# Altium footprint library 定位手表.PcbLib: 35 footprints (part 2 of 3)
Each footprint in its own frame and in the unit in brackets; x right, y up, seen from the top. Pads: shape width x height; smd on the part's side, far side on the other; paste and mask are expansions set on the pad; w line width, h text height; cw(c..) or ccw(c..) is an arc to the next point about the centre after c.
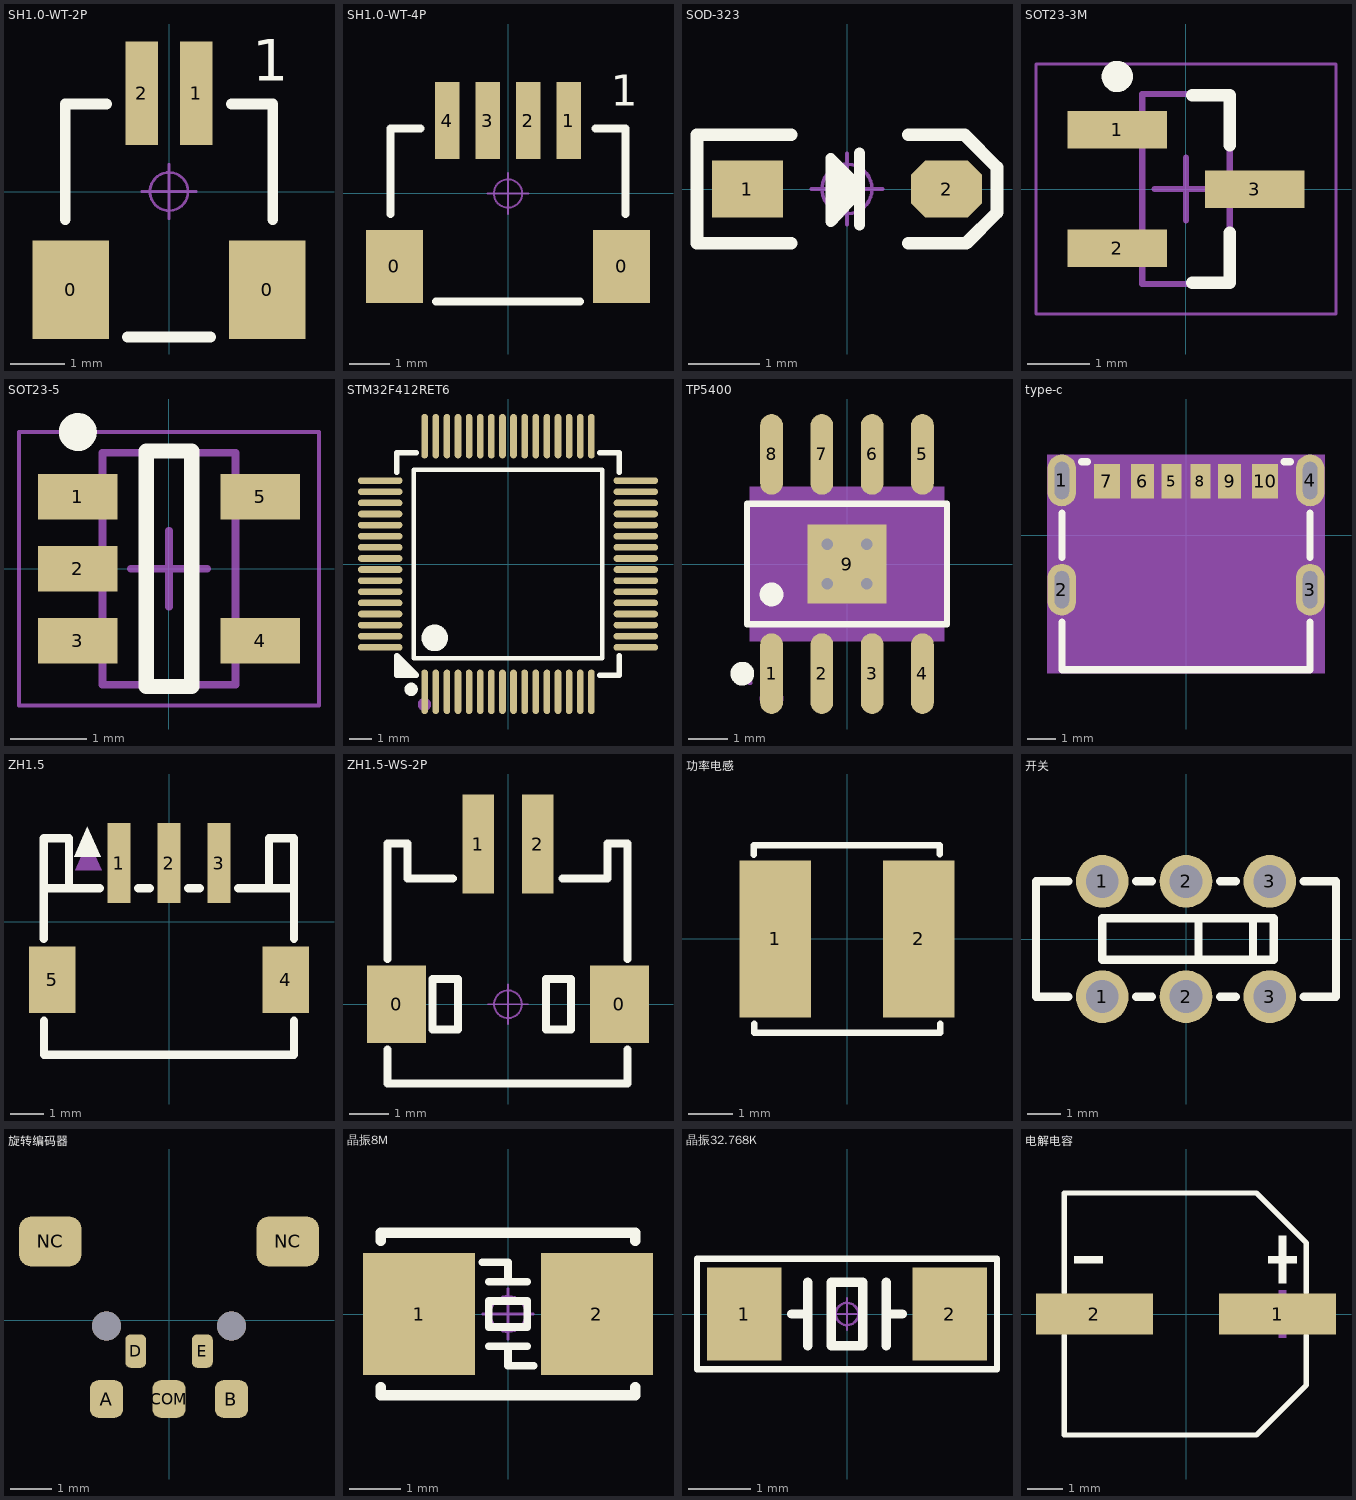
[diagram p1: the footprints below, top view; thin cyan lines are the x and y axes]

## SH1.0-WT-2P [mm] "SH1.0连接器-卧贴-2P                联系卖家 免费查找封装"
pads (4):
  rect 1.4x1.8 smd: 0(-1.8,-1.8) 0(1.8,-1.8)
  rect 0.6x1.9 smd: 1(0.5,1.8) 2(-0.5,1.8)
Top Overlay:
  lines w0.2: -1.9,-0.508 -1.9,1.6 -1.143,1.6 ; -0.762,-2.667 0.762,-2.667 ; 1.143,1.6 1.8,1.6 1.9,1.6 1.9,1.5 1.9,-0.508
  text "1" at 1.524,2.032 h0.76
Mechanical 15:
  circle w0.05: c0,0 r0.35
  lines w0.05: -0.5,0 0.5,0 ; 0,-0.5 0,0.5
3D body "SH1.0-WT-2P.STEP": height 2.9, standoff 0, extent -2,-2.667 2,2.283

## SH1.0-WT-4P [mm] "SH1.0连接器-卧贴-4P"
pads (6):
  rect 1.4x1.8 smd: 0(-2.8,-1.8) 0(2.8,-1.8)
  rect 0.6x1.9 smd: 1(1.5,1.8) 2(0.5,1.8) 3(-0.5,1.8) 4(-1.5,1.8)
Top Overlay:
  lines w0.2: -2.9,-0.508 -2.9,1.6 -2.159,1.6 ; -1.778,-2.667 1.778,-2.667 ; 2.159,1.6 2.8,1.6 2.9,1.6 2.9,1.5 2.9,-0.508
  text "1" at 2.54,2.159 h0.76
Mechanical 15:
  circle w0.05: c0,0 r0.35
  lines w0.05: -0.5,0 0.5,0 ; 0,-0.5 0,0.5
3D body "SH1.0-WT-4P.STEP": height 2.9, standoff 0, extent -3,-2.6 3,2.35

## SOD-323 [mm] "1.8x1.3X0.9mm"
pads (2):
  rect 1x0.8 smd: 1(-1.4,0)
  oct 1x0.8 smd: 2(1.4,0)
Top Overlay:
  lines w0.152: 0.178,-0.508 0.178,0.508 ; 0.178,-0.025 -0.229,-0.457 -0.229,0.432 0.178,0.025
  lines w0.178: -0.787,-0.762 -2.108,-0.762 -2.108,0.762 -0.787,0.762 ; 0.864,-0.762 1.676,-0.762 2.108,-0.33 2.108,0.305 1.651,0.762 0.864,0.762
  lines w0.254: -0.127,0.254 -0.152,-0.178 0.025,-0.025 -0.025,0.127
Mechanical 15:
  circle w0.05: c0,0 r0.35
  lines w0.05: -0.5,0 0.5,0 ; 0,-0.5 0,0.5
3D body "SOD-323.STEP": height 0.95, standoff 0, extent -1.324,-0.65 1.324,0.65

## SOT23-3M [mm] "SOT23, 3-Leads, Body 2.9x1.3mm, Pitch 0.95mm, Lead Span 2.4mm, IPC Low Density"
height 1.12
pads (3):
  rect 1.6x0.6 smd: 1(-1.1,0.95) 2(-1.1,-0.95) 3(1.1,0)
Top Overlay:
  circle w0.25: c-1.1,1.8 r0.125
  lines w0.2: 0.1,-1.5 0.7,-1.5 0.7,-0.7 ; 0.1,1.5 0.7,1.5 0.7,0.7
Mechanical 13:
  lines w0.1: -0.7,-1.52 -0.7,1.52 0.7,1.52 0.7,-1.52 -0.7,-1.52
Mechanical 15:
  lines w0.05: -2.4,-2 -2.4,2 2.4,2 2.4,-2 -2.4,-2
  lines w0.1: -0.5,0 0.5,0 ; 0,-0.5 0,0.5
3D body "SOT-23-3-20.STEP": height 1.2, standoff 0, extent -1.4,-1.45 1.4,1.45

## SOT23-5 [mm] "SOT23, 5-Leads, Body 2.9x1.6mm, Pitch 0.95mm, IPC Medium Density                联系卖家 免费查找封装"
height 1.1
pads (5):
  rect 1.05x0.6 smd: 1(-1.2,0.95) 2(-1.2,0) 3(-1.2,-0.95) 4(1.2,-0.95) 5(1.2,0.95)
Top Overlay:
  circle w0.25: c-1.2,1.8 r0.125
  lines w0.2: -0.3,-1.55 0.3,-1.55 0.3,1.55 -0.3,1.55 -0.3,-1.55
Mechanical 13:
  lines w0.1: -0.875,-1.525 0.875,-1.525 0.875,1.525 -0.875,1.525 -0.875,-1.525
Mechanical 15:
  lines w0.05: -1.975,-1.8 -1.975,1.8 1.975,1.8 1.975,-1.8 -1.975,-1.8
  lines w0.1: -0.5,0 0.5,0 ; 0,-0.5 0,0.5
3D body "SOT23-5-2.STEP": height 1.15, standoff -0.03, extent -1.403,-1.5 1.404,1.5

## STM32F412RET6 [mm]
pads (64):
  oval 0.3x2 smd: 1(-3.75,-5.75) 2(-3.25,-5.75) 3(-2.75,-5.75) 4(-2.25,-5.75) 5(-1.75,-5.75) 6(-1.25,-5.75) 7(-0.75,-5.75) 8(-0.25,-5.75) 9(0.25,-5.75) 10(0.75,-5.75) 11(1.25,-5.75) 12(1.75,-5.75) 13(2.25,-5.75) 14(2.75,-5.75) 15(3.25,-5.75) 16(3.75,-5.75) 33(3.75,5.75) 34(3.25,5.75) 35(2.75,5.75) 36(2.25,5.75) 37(1.75,5.75) 38(1.25,5.75) 39(0.75,5.75) 40(0.25,5.75) 41(-0.25,5.75) 42(-0.75,5.75) 43(-1.25,5.75) 44(-1.75,5.75) 45(-2.25,5.75) 46(-2.75,5.75) 47(-3.25,5.75) 48(-3.75,5.75)
  oval 2x0.3 smd: 17(5.75,-3.75) 18(5.75,-3.25) 19(5.75,-2.75) 20(5.75,-2.25) 21(5.75,-1.75) 22(5.75,-1.25) 23(5.75,-0.75) 24(5.75,-0.25) 25(5.75,0.25) 26(5.75,0.75) 27(5.75,1.25) 28(5.75,1.75) 29(5.75,2.25) 30(5.75,2.75) 31(5.75,3.25) 32(5.75,3.75) 49(-5.75,3.75) 50(-5.75,3.25) 51(-5.75,2.75) 52(-5.75,2.25) 53(-5.75,1.75) 54(-5.75,1.25) 55(-5.75,0.75) 56(-5.75,0.25) 57(-5.75,-0.25) 58(-5.75,-0.75) 59(-5.75,-1.25) 60(-5.75,-1.75) 61(-5.75,-2.25) 62(-5.75,-2.75) 63(-5.75,-3.25) 64(-5.75,-3.75)
Top Overlay:
  region: -4.131,-5 -5,-4.131 -5,-5
  lines w0.2: -4.25,-4.25 4.25,-4.25 4.25,4.25 -4.25,4.25 -4.25,-4.25
  lines w0.254: -5,4.131 -5,5 -4.131,5 ; 4.131,-5 5,-5 5,-4.131 ; 4.131,5 5,5 5,4.131 ; -5,-4.131 -5,-5 -4.131,-5 -5,-4.131 ; -5,-4.131 -5,-4.131
  lines w0.3: -4.361,-5.49 ccw(c-4.36,-5.64) -4.359,-5.49
  lines w0.6: -3.299,-3.025 ccw(c-3.297,-3.325) -3.294,-3.025
Mechanical 15:
  circle w0.3: c-3.76,-6.32 r0.15
3D body "LQFP64-10x10.STEP": height 1.45, standoff 0, extent -6.005,-5.987 6.001,6.018

## TP5400 [mm]
pads (13):
  oval 0.574x2.038 smd: 1(-1.905,-2.769) 2(-0.635,-2.769) 3(0.635,-2.769) 4(1.905,-2.769) 5(1.905,2.769) 6(0.635,2.769) 7(-0.635,2.769) 8(-1.905,2.769)
  rect 2x2 smd: 9(0,0)
  round 0.6 hole 0.3: ""(-0.5,-0.5) ""(-0.5,0.5) ""(0.5,-0.5) ""(0.5,0.5)
Top Overlay:
  circle w0.3: c-1.905,-0.769 r0.15
  circle w0.3: c-2.644,-2.769 r0.15
  lines w0.152: -2.526,-1.521 -2.526,1.521 2.526,1.521 2.526,-1.521 -2.526,-1.521
Mechanical 4:
  region: -2.45,-1.95 -2.45,1.95 2.45,1.95 2.45,-1.95
Mechanical 5:
  region: -2.11,-3 -2.11,-2.165 -1.7,-2.165 -1.7,-3
  pour cut-out: -2.11,-2.175 -2.11,-1.94 -1.7,-1.94 -1.7,-2.175
  region: -0.84,-3 -0.84,-2.165 -0.43,-2.165 -0.43,-3
  pour cut-out: -0.84,-2.175 -0.84,-1.94 -0.43,-1.94 -0.43,-2.175
  region: 0.43,-3 0.43,-2.165 0.84,-2.165 0.84,-3
  pour cut-out: 0.43,-2.175 0.43,-1.94 0.84,-1.94 0.84,-2.175
  region: 1.7,-3 1.7,-2.165 2.11,-2.165 2.11,-3
  pour cut-out: 1.7,-2.175 1.7,-1.94 2.11,-1.94 2.11,-2.175
  region: -2.11,3 -2.11,2.165 -1.7,2.165 -1.7,3
  pour cut-out: -2.11,2.175 -2.11,1.94 -1.7,1.94 -1.7,2.175
  region: -0.84,3 -0.84,2.165 -0.43,2.165 -0.43,3
  pour cut-out: -0.84,2.175 -0.84,1.94 -0.43,1.94 -0.43,2.175
  region: 0.43,3 0.43,2.165 0.84,2.165 0.84,3
  pour cut-out: 0.43,2.175 0.43,1.94 0.84,1.94 0.84,2.175
  region: 1.7,3 1.7,2.165 2.11,2.165 2.11,3
  pour cut-out: 1.7,2.175 1.7,1.94 2.11,1.94 2.11,2.175
  region: -1,-1 -1,1 1,1 1,-1
Mechanical 6:
  circle w0.06: c-2.45,-3 r0.03
Mechanical 15:
  circle w0.3: c-1.905,-3.4 r0.15
3D body "SO-8.STEP": height 1.7, standoff 0, extent -2.45,-3 2.45,3

## type-c [mm]
pads (10):
  oval 1x1.8 hole 0.5 slot 1.3 at 90 deg: 1(-4.32,1.9) 2(-4.32,-1.9) 3(4.32,-1.9) 4(4.32,1.9)
  rect 0.7x1.2 smd: 5(-0.5,1.88) 8(0.5,1.88)
  rect 0.8x1.2 smd: 6(-1.52,1.88) 9(1.52,1.88)
  rect 0.9x1.2 smd: 7(-2.75,1.88) 10(2.75,1.88)
Top Overlay:
  lines w0.254: -4.318,-3.031 -4.318,-4.689 4.318,-4.689 4.318,-3.031 ; -4.318,-0.769 -4.318,0.769 ; -3.633,2.55 -3.429,2.55 ; 3.42,2.55 3.633,2.55 ; 4.318,-0.769 4.318,0.769
Mechanical 4:
  region: -4.82,2.8 4.82,2.8 4.82,-4.816 -4.82,-4.816
Mechanical 5:
  region: 3.82,-1 4.82,-1 4.82,-2.8 3.82,-2.8
  region: 3.82,2.8 4.82,2.8 4.82,1 3.82,1
  region: -4.82,-1 -3.82,-1 -3.82,-2.8 -4.82,-2.8
  region: -4.82,2.8 -3.82,2.8 -3.82,1 -4.82,1
  region: 2.3,2.48 3.2,2.48 3.2,1.28 2.3,1.28
  region: 1.07,2.48 1.97,2.48 1.97,1.28 1.07,1.28
  region: 0.05,2.48 0.95,2.48 0.95,1.28 0.05,1.28
  region: -0.95,2.48 -0.05,2.48 -0.05,1.28 -0.95,1.28
  region: -1.97,2.48 -1.07,2.48 -1.07,1.28 -1.97,1.28
  region: -3.2,2.48 -2.3,2.48 -2.3,1.28 -3.2,1.28
3D body "USB_TYPE-C_b.STEP": height 3.22, standoff -0.94, extent -4.472,-4.398 4.468,2.402

## ZH1.5 [mm]
pads (5):
  rect 0.7x2.4 smd: 1(-1.5,1.75) 2(0,1.75) 3(1.5,1.75)
  rect 1.4x2 smd: 4(3.5,-1.75) 5(-3.5,-1.75)
Top Overlay:
  region: -2.85,1.95 -2.05,1.95 -2.45,2.85
  lines w0.254: -3.75,-2.981 -3.75,-4 3.75,-4 3.75,-2.981 ; -3.751,-0.518 -3.751,2.499 -3,2.499 -3,1 ; -3.751,1 -2.081,1 ; -0.919,1 -0.581,1 ; 0.581,1 0.919,1 ; 2.081,1 3.75,1 ; 3,1 3,2.5 3.75,2.5 3.75,-0.519
Mechanical 15:
  region: -2.815,1.535 -2.015,1.535 -2.415,2.435
3D body "ZH1.5-WS-3P.STEP": height 3.75, standoff 0, extent -3.844,-4.069 3.756,2.531

## ZH1.5-WS-2P [mm] "长：6.1mm，宽：2.5mm，高：3.7mm淘宝ID:黄晶宝石"
pads (4):
  rect 1.5x1.95 smd: 0(-2.818,0) 0(2.818,0)
  rect 0.8x2.5 smd: 1(-0.75,4.05) 2(0.75,4.05)
Top Overlay:
  lines w0.203: -3.048,-1.143 -3.05,-1.143 -3.05,-2 3.026,-2 3.026,-1.143 3.024,-1.143 ; -3.048,1.143 -3.05,1.143 -3.05,4.064 -2.54,4.064 -2.54,3.175 -1.397,3.175 ; 1.373,3.175 2.516,3.175 2.516,4.064 3.026,4.064 3.026,1.143 3.024,1.143 ; -1.905,-0.635 -1.905,0.635 -1.27,0.635 -1.27,-0.635 -1.905,-0.635 ; 0.961,-0.635 1.596,-0.635 1.596,0.635 0.961,0.635 0.961,-0.635
Mechanical 15:
  circle w0.05: c0,0 r0.35
  lines w0.05: -0.5,0 0.5,0 ; 0,-0.5 0,0.5
3D body "ZH1.5-WS-2P.STEP": height 3.75, standoff 0, extent -3.05,-2 3.05,4.6

## 功率电感 [mm]
pads (2):
  rect 1.6x3.5 smd: 1(-1.6,0) 2(1.6,0)
Top Overlay:
  lines w0.15: -2.08,1.88 -2.083,2.095 2.07,2.095 2.07,1.9 ; -2.07,-1.89 -2.07,-2.096 2.082,-2.096 2.08,-1.9
3D body "4030.STEP": height 3, standoff -0.02, extent -1.997,-2.011 2.003,1.989

## 开关 [mm]
pads (6):
  round 1.6 hole 1: 1(-2.54,-1.75) 1(-2.54,1.75) 2(0,-1.75) 2(0,1.75) 3(2.54,-1.75) 3(2.54,1.75)
Top Overlay:
  lines w0.254: -3.571,-1.75 -4.55,-1.75 -4.55,1.75 -3.571,1.75 ; -1.509,-1.75 -1.031,-1.75 ; -1.509,1.75 -1.031,1.75 ; 1.031,-1.75 1.509,-1.75 ; 1.031,1.75 1.509,1.75 ; 3.571,-1.75 4.55,-1.75 4.55,1.75 3.571,1.75 ; -2.54,-0.635 2.667,-0.635 2.667,0.635 -2.54,0.635 -2.54,-0.635 ; 0.381,-0.635 2.032,-0.635 2.032,0.635 0.381,0.635 0.381,-0.635
3D body "开关2.step": height 7.65, standoff -2.95, extent -4.55,-1.75 4.55,1.95

## 旋转编码器 [mm]
pads (7):
  rrect50% 0.8x0.9 smd: A(-1.5,-1.89) B(1.5,-1.89) COM(0,-1.89)
  rrect50% 0.5x0.8 smd: D(-0.8,-0.74) E(0.8,-0.74)
  rrect50% 1.5x1.2 smd: NC(-2.85,1.89) NC(2.85,1.89)
via 1.5,-0.14 diameter 0.7 hole 0.7
via -1.5,-0.14 diameter 0.7 hole 0.7

## 晶振8M [mm] "5mm*3.2mm*0.8mm(长*宽*高)"
pads (2):
  rect 2.2x2.4 smd: 1(-1.75,0) 2(1.75,0)
Top Overlay:
  lines w0.152: -0.508,1.016 0,1.016 0,0.635 ; -0.381,-0.635 0.381,-0.635 ; -0.381,0.635 0.381,0.635 ; 0,-0.635 0,-1.016 0.381,-1.016 0.508,-1.016 ; -0.381,-0.254 -0.381,0.254 0.381,0.254 0.381,-0.254 -0.381,-0.254
  lines w0.203: -2.5,-1.437 -2.5,-1.6 2.5,-1.6 2.5,-1.437 ; -2.5,1.437 -2.5,1.6 2.5,1.6 2.5,1.437
Mechanical 15:
  circle w0.05: c0,0 r0.35
  lines w0.05: -0.5,0 0.5,0 ; 0,-0.5 0,0.5
3D body "OSC_5032-2.STEP": height 0.86, standoff 0.04, extent -2.5,-1.6 2.5,1.6

## 晶振32.768K [mm] "3.2*1.5*0.6mm(长宽高)"
pads (2):
  rect 1.2x1.5 smd: 1(-1.65,0) 2(1.65,0)
Top Overlay:
  lines w0.1: -2.413,-0.889 2.413,-0.889 2.413,0.889 -2.413,0.889 -2.413,-0.889
  lines w0.152: -0.889,0 -0.635,0 ; -0.635,-0.508 -0.635,0.508 ; 0.635,-0.508 0.635,0.508 ; 0.635,0 0.889,0 ; -0.254,-0.508 -0.254,0.508 0.254,0.508 0.254,-0.508 -0.254,-0.508
Mechanical 15:
  circle w0.04: c0,0 r0.18
  lines w0.04: -0.254,0 0.254,0 ; 0,-0.254 0,0.254
3D body "OSC_3215-2.STEP": height 0.61, standoff -0.01, extent -1.6,-0.75 1.6,0.75

## 电解电容 [mm]
pads (2):
  rect 3.26x1.15 smd: 1(2.555,0) 2(-2.555,0)
Top Overlay:
  region: 2.79,0.858 2.79,2.178 2.592,2.178 2.592,0.858
  region: 3.087,1.419 3.087,1.617 2.295,1.617 2.295,1.419
  region: -3.117,1.419 -3.117,1.617 -2.325,1.617 -2.325,1.419
  lines w0.152: -3.391,-0.607 -3.391,-3.376 1.965,-3.376 3.361,-1.98 3.361,-0.607 ; -3.391,0.607 -3.391,3.376 1.965,3.376 3.361,1.98 3.361,0.607
Mechanical 15:
  region: 2.79,-0.66 2.79,0.66 2.592,0.66 2.592,-0.66
  region: 3.087,-0.099 3.087,0.099 2.295,0.099 2.295,-0.099
  region: -3.117,-0.099 -3.117,0.099 -2.325,0.099 -2.325,-0.099
3D body "CS_SMD_6x6-B.STEP": height 6.05, standoff 0.04, extent -3.646,-3.16 3.354,3.14